# Altium integrated library Altium_WR-MJ (rev20b).IntLib: 83 symbols
Pins are listed as number, name and electrical type; pins without a type are passive.

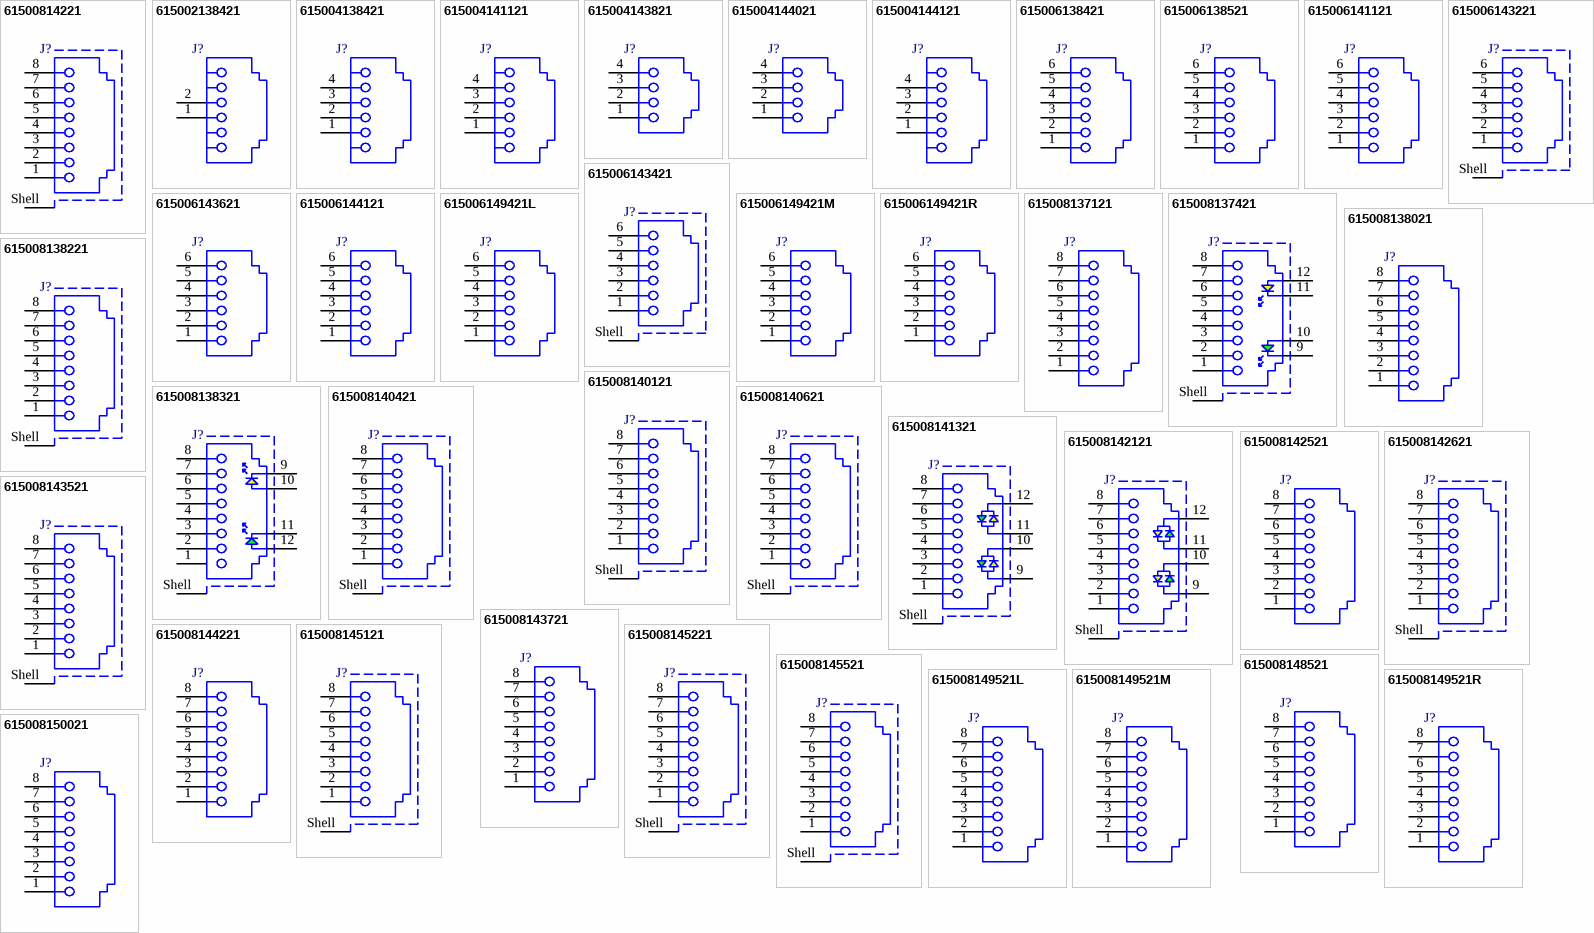
[diagram p0: symbols 61500814221 to 615008150021]

## 61500814221
designator J?
WR-MJ Modular Jack THT Horizontal Shielded 8P8C Tab Down; Manufacturer: Wurth Elektronik; Manufacturer Part Number: 61500814221; Rated Current: 1.5A; Contact Resistance: 20mOhm; Insulation Resistance: 500MOhm; Working Voltage: 120VAC; Withstanding Voltage: 1000VAC; ComponentLink1Description: Manufacturer; ComponentLink1URL: http://www.we-online.de; ComponentLink2Description: Datasheet; ComponentLink2URL: https://katalog.we-online.com/em/datasheet/61500814221.pdf; Packaging: Tray; Mounting Technology: THT; Operating Temperature: -40 to +85degC; Published Date: September 2020; xPxC: 8P8C; Type: Horizontal
footprint 61500814221
pins: 1, 2, 3, 4, 5, 6, 7, 8, Shell

## 615002138421
designator J?
WR-MJ Modular Jack THT Horizontal Plastic 6P2C Tab Up; Manufacturer: Wurth Elektronik; Manufacturer Part Number: 615002138421; Rated Current: 1.5A; Contact Resistance: 20mOhm; Insulation Resistance: 500MOhm; Working Voltage: 120VAC; Withstanding Voltage: 1000VAC; ComponentLink1Description: Manufacturer; ComponentLink1URL: http://www.we-online.de; ComponentLink2Description: Datasheet; ComponentLink2URL: https://katalog.we-online.com/em/datasheet/615002138421.pdf; Packaging: Tray; Mounting Technology: THT; Operating Temperature: -40 to +85degC; Published Date: September 2020; xPxC: 6P2C; Type: Horizontal
footprint 615002138421
pins: 1, 2

## 615004138421
designator J?
WR-MJ Modular Jack THT Horizontal Plastic 6P4C Tab Up; Manufacturer: Wurth Elektronik; Manufacturer Part Number: 615004138421; Rated Current: 1.5A; Contact Resistance: 20mOhm; Insulation Resistance: 500MOhm; Working Voltage: 120VAC; Withstanding Voltage: 1000VAC; ComponentLink1Description: Manufacturer; ComponentLink1URL: http://www.we-online.de; ComponentLink2Description: Datasheet; ComponentLink2URL: https://katalog.we-online.com/em/datasheet/615004138421.pdf; Packaging: Tray; Mounting Technology: THT; Operating Temperature: -40 to +85degC; Published Date: September 2020; xPxC: 6P4C; Type: Horizontal
footprint 615004138421
pins: 1, 2, 3, 4

## 615004141121
designator J?
WR-MJ Modular Jack THT Horizontal Plastic 6P4C Tab Down; Manufacturer: Wurth Elektronik; Manufacturer Part Number: 615004141121; Rated Current: 1.5A; Contact Resistance: 20mOhm; Insulation Resistance: 500MOhm; Working Voltage: 120VAC; Withstanding Voltage: 1000VAC; ComponentLink1Description: Manufacturer; ComponentLink1URL: http://www.we-online.de; ComponentLink2Description: Datasheet; ComponentLink2URL: https://katalog.we-online.com/em/datasheet/615004141121.pdf; Packaging: Tray; Mounting Technology: THT; Operating Temperature: -40 to +85degC; Published Date: September 2020; xPxC: 6P4C; Type: Horizontal
footprint 615004141121
pins: 1, 2, 3, 4

## 615004143821
designator J?
WR-MJ Modular Jack THT Horizontal Plastic 4P4C Tab Up; Manufacturer: Wurth Elektronik; Manufacturer Part Number: 615004143821; Rated Current: 1.5A; Contact Resistance: 20mOhm; Insulation Resistance: 500MOhm; Working Voltage: 120VAC; Withstanding Voltage: 1000VAC; ComponentLink1Description: Manufacturer; ComponentLink1URL: http://www.we-online.de; ComponentLink2Description: Datasheet; ComponentLink2URL: https://katalog.we-online.com/em/datasheet/615004143821.pdf; Packaging: Tray; Mounting Technology: THT; Operating Temperature: -40 to +85degC; Published Date: September 2020; xPxC: 4P4C; Type: Horizontal
footprint 615004143821
pins: 1, 2, 3, 4

## 615004144021
designator J?
WR-MJ Modular Jack THT Vertical Plastic 4P4C with Ears; Manufacturer: Wurth Elektronik; Manufacturer Part Number: 615004144021; Rated Current: 1.5A; Contact Resistance: 20mOhm; Insulation Resistance: 500MOhm; Working Voltage: 120VAC; Withstanding Voltage: 1000VAC; ComponentLink1Description: Manufacturer; ComponentLink1URL: http://www.we-online.de; ComponentLink2Description: Datasheet; ComponentLink2URL: https://katalog.we-online.com/em/datasheet/615004144021.pdf; Packaging: Tray; Mounting Technology: THT; Operating Temperature: -40 to +85degC; Published Date: September 2020; xPxC: 4P4C; Type: Vertical
footprint 615004144021
pins: 1, 2, 3, 4

## 615004144121
designator J?
WR-MJ Modular Jack THT Vertical Plastic 6P4C with Ears; Manufacturer: Wurth Elektronik; Manufacturer Part Number: 615004144121; Rated Current: 1.5A; Contact Resistance: 20mOhm; Insulation Resistance: 500MOhm; Working Voltage: 120VAC; Withstanding Voltage: 1000VAC; ComponentLink1Description: Manufacturer; ComponentLink1URL: http://www.we-online.de; ComponentLink2Description: Datasheet; ComponentLink2URL: https://katalog.we-online.com/em/datasheet/615004144121.pdf; Packaging: Tray; Mounting Technology: THT; Operating Temperature: -40 to +85degC; Published Date: September 2020; xPxC: 6P4C; Type: Vertical
footprint 615004144121
pins: 1, 2, 3, 4

## 615006138421
designator J?
WR-MJ Modular Jack THT Horizontal Plastic 6P6C Tab Up; Manufacturer: Wurth Elektronik; Manufacturer Part Number: 615006138421; Rated Current: 1.5A; Contact Resistance: 20mOhm; Insulation Resistance: 500MOhm; Working Voltage: 120VAC; Withstanding Voltage: 1000VAC; ComponentLink1Description: Manufacturer; ComponentLink1URL: http://www.we-online.de; ComponentLink2Description: Datasheet; ComponentLink2URL: https://katalog.we-online.com/em/datasheet/615006138421.pdf; Packaging: Tray; Mounting Technology: THT; Operating Temperature: -40 to +85degC; Published Date: September 2020; xPxC: 6P6C; Type: Horizontal
footprint 615006138421
pins: 1, 2, 3, 4, 5, 6

## 615006138521
designator J?
WR-MJ Modular Jack THT Vertical Plastic 6P6C with Ears; Manufacturer: Wurth Elektronik; Manufacturer Part Number: 615006138521; Rated Current: 1.5A; Contact Resistance: 20mOhm; Insulation Resistance: 500MOhm; Working Voltage: 120VAC; Withstanding Voltage: 1000VAC; ComponentLink1Description: Manufacturer; ComponentLink1URL: http://www.we-online.de; ComponentLink2Description: Datasheet; ComponentLink2URL: https://katalog.we-online.com/em/datasheet/615006138521.pdf; Packaging: Tray; Mounting Technology: THT; Operating Temperature: -40 to +85degC; Published Date: September 2020; xPxC: 6P6C; Type: Vertical
footprint 615006138521
pins: 1, 2, 3, 4, 5, 6

## 615006141121
designator J?
WR-MJ Modular Jack THT Horizontal Plastic 6P6C Tab Down; Manufacturer: Wurth Elektronik; Manufacturer Part Number: 615006141121; Rated Current: 1.5A; Contact Resistance: 20mOhm; Insulation Resistance: 500MOhm; Working Voltage: 120VAC; Withstanding Voltage: 1000VAC; ComponentLink1Description: Manufacturer; ComponentLink1URL: http://www.we-online.de; ComponentLink2Description: Datasheet; ComponentLink2URL: https://katalog.we-online.com/em/datasheet/615006141121.pdf; Packaging: Tray; Mounting Technology: THT; Operating Temperature: -40 to +85degC; Published Date: September 2020; xPxC: 6P6C; Type: Horizontal
footprint 615006141121
pins: 1, 2, 3, 4, 5, 6

## 615006143221
designator J?
WR-MJ Modular Jack THT Horizontal Shielded 6P6C Tab Up; Manufacturer: Wurth Elektronik; Manufacturer Part Number: 615006143221; Rated Current: 1.5A; Contact Resistance: 20mOhm; Insulation Resistance: 500MOhm; Working Voltage: 120VAC; Withstanding Voltage: 1000VAC; ComponentLink1Description: Manufacturer; ComponentLink1URL: http://www.we-online.de; ComponentLink2Description: Datasheet; ComponentLink2URL: https://katalog.we-online.com/em/datasheet/615006143221.pdf; Packaging: Tray; Mounting Technology: THT; Operating Temperature: -40 to +85degC; Published Date: September 2020; xPxC: 6P6C; Type: Horizontal
footprint 615006143221
pins: 1, 2, 3, 4, 5, 6, Shell

## 615006143421
designator J?
WR-MJ Modular Jack THT Horizontal Half Shielded 6P6C Tab Down; Manufacturer: Wurth Elektronik; Manufacturer Part Number: 615006143421; Rated Current: 1.5A; Contact Resistance: 20mOhm; Insulation Resistance: 500MOhm; Working Voltage: 120VAC; Withstanding Voltage: 1000VAC; ComponentLink1Description: Manufacturer; ComponentLink1URL: http://www.we-online.de; ComponentLink2Description: Datasheet; ComponentLink2URL: https://katalog.we-online.com/em/datasheet/615006143421.pdf; Packaging: Tray; Mounting Technology: THT; Operating Temperature: -40 to +85degC; Published Date: September 2020; xPxC: 6P6C; Type: Horizontal
footprint 615006143421
pins: 1, 2, 3, 4, 5, 6, Shell

## 615006143621
designator J?
WR-MJ Modular Jack THT Horizontal Plastic 6P6C Tab Down; Manufacturer: Wurth Elektronik; Manufacturer Part Number: 615006143621; Rated Current: 1.5A; Contact Resistance: 20mOhm; Insulation Resistance: 500MOhm; Working Voltage: 120VAC; Withstanding Voltage: 1000VAC; ComponentLink1Description: Manufacturer; ComponentLink1URL: http://www.we-online.de; ComponentLink2Description: Datasheet; ComponentLink2URL: https://katalog.we-online.com/em/datasheet/615006143621.pdf; Packaging: Tray; Mounting Technology: THT; Operating Temperature: -40 to +85degC; Published Date: September 2020; xPxC: 6P6C; Type: Horizontal
footprint 615006143621
pins: 1, 2, 3, 4, 5, 6

## 615006144121
designator J?
WR-MJ Modular Jack THT Vertical Plastic 6P6C with Ears; Manufacturer: Wurth Elektronik; Manufacturer Part Number: 615006144121; Rated Current: 1.5A; Contact Resistance: 20mOhm; Insulation Resistance: 500MOhm; Working Voltage: 120VAC; Withstanding Voltage: 1000VAC; ComponentLink1Description: Manufacturer; ComponentLink1URL: http://www.we-online.de; ComponentLink2Description: Datasheet; ComponentLink2URL: https://katalog.we-online.com/em/datasheet/615006144121.pdf; Packaging: Tray; Mounting Technology: THT; Operating Temperature: -40 to +85degC; Published Date: September 2020; xPxC: 6P6C; Type: Vertical
footprint 615006144121
pins: 1, 2, 3, 4, 5, 6

## 615006149421L
designator J?
WR-MJ Modular Jack THT Horizontal Plastic 6P6C Assembly Tab Up; Manufacturer: Wurth Elektronik; Manufacturer Part Number: 615006149421L; Rated Current: 1.5A; Contact Resistance: 20mOhm; Insulation Resistance: 500MOhm; Working Voltage: 120VAC; Withstanding Voltage: 1000VAC; ComponentLink1Description: Manufacturer; ComponentLink1URL: http://www.we-online.de; ComponentLink2Description: Datasheet; ComponentLink2URL: https://katalog.we-online.com/em/datasheet/615006149421L.pdf; Packaging: Tray; Mounting Technology: THT; Operating Temperature: -40 to +85degC; Published Date: September 2020; xPxC: 6P6C; Type: Horizontal
footprint 615006149421L
pins: 1, 2, 3, 4, 5, 6

## 615006149421M
designator J?
WR-MJ Modular Jack THT Horizontal Plastic 6P6C Assembly Tab Up; Manufacturer: Wurth Elektronik; Manufacturer Part Number: 615006149421M; Rated Current: 1.5A; Contact Resistance: 20mOhm; Insulation Resistance: 500MOhm; Working Voltage: 120VAC; Withstanding Voltage: 1000VAC; ComponentLink1Description: Manufacturer; ComponentLink1URL: http://www.we-online.de; ComponentLink2Description: Datasheet; ComponentLink2URL: https://katalog.we-online.com/em/datasheet/615006149421M.pdf; Packaging: Tray; Mounting Technology: THT; Operating Temperature: -40 to +85degC; Published Date: September 2020; xPxC: 6P6C; Type: Horizontal
footprint 615006149421M
pins: 1, 2, 3, 4, 5, 6

## 615006149421R
designator J?
WR-MJ Modular Jack THT Horizontal Plastic 6P6C Assembly Tab Up; Manufacturer: Wurth Elektronik; Manufacturer Part Number: 615006149421R; Rated Current: 1.5A; Contact Resistance: 20mOhm; Insulation Resistance: 500MOhm; Working Voltage: 120VAC; Withstanding Voltage: 1000VAC; ComponentLink1Description: Manufacturer; ComponentLink1URL: http://www.we-online.de; ComponentLink2Description: Datasheet; ComponentLink2URL: https://katalog.we-online.com/em/datasheet/615006149421R.pdf; Packaging: Tray; Mounting Technology: THT; Operating Temperature: -40 to +85degC; Published Date: September 2020; xPxC: 6P6C; Type: Horizontal
footprint 615006149421R
pins: 1, 2, 3, 4, 5, 6

## 615008137121
designator J?
WR-MJ Modular Jack THT Horizontal Plastic 8P8C Tab Down; Manufacturer: Wurth Elektronik; Manufacturer Part Number: 615008137121; Rated Current: 1.5A; Contact Resistance: 20mOhm; Insulation Resistance: 500MOhm; Working Voltage: 120VAC; Withstanding Voltage: 1000VAC; ComponentLink1Description: Manufacturer; ComponentLink1URL: http://www.we-online.de; ComponentLink2Description: Datasheet; ComponentLink2URL: https://katalog.we-online.com/em/datasheet/615008137121.pdf; Packaging: Tray; Mounting Technology: THT; Operating Temperature: -40 to +85degC; Published Date: September 2020; xPxC: 8P8C; Type: Horizontal
footprint 615008137121
pins: 1, 2, 3, 4, 5, 6, 7, 8

## 615008137421
designator J?
WR-MJ Modular Jack THT Horizontal Shielded 8P8C Tab Up; Manufacturer: Wurth Elektronik; Manufacturer Part Number: 615008137421; Rated Current: 1.5A; Contact Resistance: 20mOhm; Insulation Resistance: 500MOhm; Working Voltage: 120VAC; Withstanding Voltage: 1000VAC; ComponentLink1Description: Manufacturer; ComponentLink1URL: http://www.we-online.de; ComponentLink2Description: Datasheet; ComponentLink2URL: https://katalog.we-online.com/em/datasheet/615008137421.pdf; Packaging: Tray; Mounting Technology: THT; Operating Temperature: -40 to +85degC; Published Date: September 2020; xPxC: 8P8C; Type: Horizontal
footprint 615008137421
pins: 1, 2, 3, 4, 5, 6, 7, 8, 9, 10, 11, 12, Shell

## 615008138021
designator J?
WR-MJ Modular Jack THT Vertical Plastic 8P8C; Manufacturer: Wurth Elektronik; Manufacturer Part Number: 615008138021; Rated Current: 1.5A; Contact Resistance: 20mOhm; Insulation Resistance: 500MOhm; Working Voltage: 120VAC; Withstanding Voltage: 1000VAC; ComponentLink1Description: Manufacturer; ComponentLink1URL: http://www.we-online.de; ComponentLink2Description: Datasheet; ComponentLink2URL: https://katalog.we-online.com/em/datasheet/615008138021.pdf; Packaging: Tray; Mounting Technology: THT; Operating Temperature: -40 to +85degC; Published Date: September 2020; xPxC: 8P8C; Type: Vertical
footprint 615008138021
pins: 1, 2, 3, 4, 5, 6, 7, 8

## 615008138221
designator J?
WR-MJ Modular Jack THT Vertical Shielded 8P8C Front Post; Manufacturer: Wurth Elektronik; Manufacturer Part Number: 615008138221; Rated Current: 1.5A; Contact Resistance: 20mOhm; Insulation Resistance: 500MOhm; Working Voltage: 120VAC; Withstanding Voltage: 1000VAC; ComponentLink1Description: Manufacturer; ComponentLink1URL: http://www.we-online.de; ComponentLink2Description: Datasheet; ComponentLink2URL: https://katalog.we-online.com/em/datasheet/615008138221.pdf; Packaging: Tray; Mounting Technology: THT; Operating Temperature: -40 to +85degC; Published Date: September 2020; xPxC: 8P8C; Type: Vertical
footprint 615008138221
pins: 1, 2, 3, 4, 5, 6, 7, 8, Shell

## 615008138321
designator J?
WR-MJ Modular Jack THT Vertical Shielded 8P8C with LED; Manufacturer: Wurth Elektronik; Manufacturer Part Number: 615008138321; Rated Current: 1.5A; Contact Resistance: 20mOhm; Insulation Resistance: 500MOhm; Working Voltage: 120VAC; Withstanding Voltage: 1000VAC; ComponentLink1Description: Manufacturer; ComponentLink1URL: http://www.we-online.de; ComponentLink2Description: Datasheet; ComponentLink2URL: https://katalog.we-online.com/em/datasheet/615008138321.pdf; Packaging: Tray; Mounting Technology: THT; Operating Temperature: -40 to +85degC; Published Date: September 2020; xPxC: 8P8C; Type: Vertical
footprint 615008138321
pins: 1, 2, 3, 4, 5, 6, 7, 8, 9, 10, 11, 12, Shell

## 615008140121
designator J?
WR-MJ Modular Jack THT Horizontal Shielded Front Grounding Post 8P8C Tab Down; Manufacturer: Wurth Elektronik; Manufacturer Part Number: 615008140121; Rated Current: 1.5A; Contact Resistance: 20mOhm; Insulation Resistance: 500MOhm; Working Voltage: 120VAC; Withstanding Voltage: 1000VAC; ComponentLink1Description: Manufacturer; ComponentLink1URL: http://www.we-online.de; ComponentLink2Description: Datasheet; ComponentLink2URL: https://katalog.we-online.com/em/datasheet/615008140121.pdf; Packaging: Tray; Mounting Technology: THT; Operating Temperature: -40 to +85degC; Published Date: September 2020; xPxC: 8P8C; Type: Horizontal
footprint 615008140121
pins: 1, 2, 3, 4, 5, 6, 7, 8, Shell

## 615008140421
designator J?
WR-MJ Modular Jack THT Vertical Shielded 8P8C Rear Post; Manufacturer: Wurth Elektronik; Manufacturer Part Number: 615008140421; Rated Current: 1.5A; Contact Resistance: 20mOhm; Insulation Resistance: 500MOhm; Working Voltage: 120VAC; Withstanding Voltage: 1000VAC; ComponentLink1Description: Manufacturer; ComponentLink1URL: http://www.we-online.de; ComponentLink2Description: Datasheet; ComponentLink2URL: https://katalog.we-online.com/em/datasheet/615008140421.pdf; Packaging: Tray; Mounting Technology: THT; Operating Temperature: -40 to +85degC; Published Date: September 2020; xPxC: 8P8C; Type: Vertical
footprint 615008140421
pins: 1, 2, 3, 4, 5, 6, 7, 8, Shell

## 615008140621
designator J?
WR-MJ Modular Jack THT Horizontal Shielded with EMI Panel Finger 8P8C Tab Up; Manufacturer: Wurth Elektronik; Manufacturer Part Number: 615008140621; Rated Current: 1.5A; Contact Resistance: 20mOhm; Insulation Resistance: 500MOhm; Working Voltage: 120VAC; Withstanding Voltage: 1000VAC; ComponentLink1Description: Manufacturer; ComponentLink1URL: http://www.we-online.de; ComponentLink2Description: Datasheet; ComponentLink2URL: https://katalog.we-online.com/em/datasheet/615008140621.pdf; Packaging: Tray; Mounting Technology: THT; Operating Temperature: -40 to +85degC; Published Date: September 2020; xPxC: 8P8C; Type: Horizontal
footprint 615008140621
pins: 1, 2, 3, 4, 5, 6, 7, 8, Shell

## 615008141321
designator J?
WR-MJ Modular Jack THT Horizontal Shielded 8P8C Tab Up; Manufacturer: Wurth Elektronik; Manufacturer Part Number: 615008141321; Rated Current: 1.5A; Contact Resistance: 20mOhm; Insulation Resistance: 500MOhm; Working Voltage: 120VAC; Withstanding Voltage: 1000VAC; ComponentLink1Description: Manufacturer; ComponentLink1URL: http://www.we-online.de; ComponentLink2Description: Datasheet; ComponentLink2URL: https://katalog.we-online.com/em/datasheet/615008141321.pdf; Packaging: Tray; Mounting Technology: THT; Operating Temperature: -40 to +85degC; Published Date: September 2020; xPxC: 8P8C; Type: Horizontal
footprint 615008141321
pins: 1, 2, 3, 4, 5, 6, 7, 8, 9, 10, 11, 12, Shell

## 615008142121
designator J?
WR-MJ Modular Jack THT Horizontal Shielded 8P8C Tab Up; Manufacturer: Wurth Elektronik; Manufacturer Part Number: 615008142121; Rated Current: 1.5A; Contact Resistance: 20mOhm; Insulation Resistance: 500MOhm; Working Voltage: 120VAC; Withstanding Voltage: 1000VAC; ComponentLink1Description: Manufacturer; ComponentLink1URL: http://www.we-online.de; ComponentLink2Description: Datasheet; ComponentLink2URL: https://katalog.we-online.com/em/datasheet/615008142121.pdf; Packaging: Tray; Mounting Technology: THT; Operating Temperature: -40 to +85degC; Published Date: September 2020; xPxC: 8P8C; Type: Horizontal
footprint 615008142121
pins: 1, 2, 3, 4, 5, 6, 7, 8, 9, 10, 11, 12, Shell

## 615008142521
designator J?
WR-MJ Modular Jack THT 45deg Plastic 8P8C; Manufacturer: Wurth Elektronik; Manufacturer Part Number: 615008142521; Rated Current: 1.5A; Contact Resistance: 20mOhm; Insulation Resistance: 500MOhm; Working Voltage: 120VAC; Withstanding Voltage: 1000VAC; ComponentLink1Description: Manufacturer; ComponentLink1URL: http://www.we-online.de; ComponentLink2Description: Datasheet; ComponentLink2URL: https://katalog.we-online.com/em/datasheet/615008142521.pdf; Packaging: Tray; Mounting Technology: THT; Operating Temperature: -40 to +85degC; Published Date: September 2020; xPxC: 8P8C; Type: 45deg
footprint 615008142521
pins: 1, 2, 3, 4, 5, 6, 7, 8

## 615008142621
designator J?
WR-MJ Modular Jack THT Horizontal Shielded Rear Grounding Post 8P8C Tab Down; Manufacturer: Wurth Elektronik; Manufacturer Part Number: 615008142621; Rated Current: 1.5A; Contact Resistance: 20mOhm; Insulation Resistance: 500MOhm; Working Voltage: 120VAC; Withstanding Voltage: 1000VAC; ComponentLink1Description: Manufacturer; ComponentLink1URL: http://www.we-online.de; ComponentLink2Description: Datasheet; ComponentLink2URL: https://katalog.we-online.com/em/datasheet/615008142621.pdf; Packaging: Tray; Mounting Technology: THT; Operating Temperature: -40 to +85degC; Published Date: September 2020; xPxC: 8P8C; Type: Horizontal
footprint 615008142621
pins: 1, 2, 3, 4, 5, 6, 7, 8, Shell

## 615008143521
designator J?
WR-MJ Modular Jack THT Horizontal Half Shielded 8P8C Tab Down; Manufacturer: Wurth Elektronik; Manufacturer Part Number: 615008143521; Rated Current: 1.5A; Contact Resistance: 20mOhm; Insulation Resistance: 500MOhm; Working Voltage: 120VAC; Withstanding Voltage: 1000VAC; ComponentLink1Description: Manufacturer; ComponentLink1URL: http://www.we-online.de; ComponentLink2Description: Datasheet; ComponentLink2URL: https://katalog.we-online.com/em/datasheet/615008143521.pdf; Packaging: Tray; Mounting Technology: THT; Operating Temperature: -40 to +85degC; Published Date: September 2020; xPxC: 8P8C; Type: Horizontal
footprint 615008143521
pins: 1, 2, 3, 4, 5, 6, 7, 8, Shell

## 615008143721
designator J?
WR-MJ Modular Jack THT Horizontal Plastic 8P8C Tab Down; Manufacturer: Wurth Elektronik; Manufacturer Part Number: 615008143721; Rated Current: 1.5A; Contact Resistance: 20mOhm; Insulation Resistance: 500MOhm; Working Voltage: 120VAC; Withstanding Voltage: 1000VAC; ComponentLink1Description: Manufacturer; ComponentLink1URL: http://www.we-online.de; ComponentLink2Description: Datasheet; ComponentLink2URL: https://katalog.we-online.com/em/datasheet/615008143721.pdf; Packaging: Tray; Mounting Technology: THT; Operating Temperature: -40 to +85degC; Published Date: September 2020; xPxC: 8P8C; Type: Horizontal
footprint 615008143721
pins: 1, 2, 3, 4, 5, 6, 7, 8

## 615008144221
designator J?
WR-MJ Modular Jack THT Vertical Plastic 8P8C with Ears; Manufacturer: Wurth Elektronik; Manufacturer Part Number: 615008144221; Rated Current: 1.5A; Contact Resistance: 20mOhm; Insulation Resistance: 500MOhm; Working Voltage: 120VAC; Withstanding Voltage: 1000VAC; ComponentLink1Description: Manufacturer; ComponentLink1URL: http://www.we-online.de; ComponentLink2Description: Datasheet; ComponentLink2URL: https://katalog.we-online.com/em/datasheet/615008144221.pdf; Packaging: Tray; Mounting Technology: THT; Operating Temperature: -40 to +85degC; Published Date: September 2020; xPxC: 8P8C; Type: Vertical
footprint 615008144221
pins: 1, 2, 3, 4, 5, 6, 7, 8

## 615008145121
designator J?
WR-MJ Modular Jack THT 45deg Entry Shielded 8P8C Standard & Reverse Metal Post Trail; Manufacturer: Wurth Elektronik; Manufacturer Part Number: 615008145121; Rated Current: 1.5A; Contact Resistance: 20mOhm; Insulation Resistance: 500MOhm; Working Voltage: 120VAC; Withstanding Voltage: 1000VAC; ComponentLink1Description: Manufacturer; ComponentLink1URL: http://www.we-online.de; ComponentLink2Description: Datasheet; ComponentLink2URL: https://katalog.we-online.com/em/datasheet/615008145121.pdf; Packaging: Tray; Mounting Technology: THT; Operating Temperature: -40 to +85degC; Published Date: September 2020; xPxC: 8P8C; Type: 45deg
footprint 615008145121
pins: 1, 2, 3, 4, 5, 6, 7, 8, Shell

## 615008145221
designator J?
WR-MJ Modular Jack THT 45deg Entry Shielded 8P8C Standard & Reverse Metal Post Trail; Manufacturer: Wurth Elektronik; Manufacturer Part Number: 615008145221; Rated Current: 1.5A; Contact Resistance: 20mOhm; Insulation Resistance: 500MOhm; Working Voltage: 120VAC; Withstanding Voltage: 1000VAC; ComponentLink1Description: Manufacturer; ComponentLink1URL: http://www.we-online.de; ComponentLink2Description: Datasheet; ComponentLink2URL: https://katalog.we-online.com/em/datasheet/615008145221.pdf; Packaging: Tray; Mounting Technology: THT; Operating Temperature: -40 to +85degC; Published Date: September 2020; xPxC: 8P8C; Type: 45deg
footprint 615008145221
pins: 1, 2, 3, 4, 5, 6, 7, 8, Shell

## 615008145521
designator J?
WR-MJ Modular Jack THT Horizontal Shielded with EMI Panel Finger 8P8C CAT 5e Tab Down; Manufacturer: Wurth Elektronik; Manufacturer Part Number: 615008145521; Rated Current: 1.5A; Contact Resistance: 20mOhm; Insulation Resistance: 500MOhm; Working Voltage: 125VAC; Withstanding Voltage: 1000VAC; ComponentLink1Description: Manufacturer; ComponentLink1URL: http://www.we-online.de; ComponentLink2Description: Datasheet; ComponentLink2URL: https://katalog.we-online.com/em/datasheet/615008145521.pdf; Packaging: Tray; Mounting Technology: THT; Operating Temperature: -40 to +85degC; Published Date: September 2020; xPxC: 8P8C; Type: Horizontal
footprint 615008145521
pins: 1, 2, 3, 4, 5, 6, 7, 8, Shell

## 615008148521
designator J?
WR-MJ Modular Jack THT Horizontal Plastic 8P8C Tab Up; Manufacturer: Wurth Elektronik; Manufacturer Part Number: 615008148521; Rated Current: 1.5A; Contact Resistance: 20mOhm; Insulation Resistance: 500MOhm; Working Voltage: 120VAC; Withstanding Voltage: 1000VAC; ComponentLink1Description: Manufacturer; ComponentLink1URL: http://www.we-online.de; ComponentLink2Description: Datasheet; ComponentLink2URL: https://katalog.we-online.com/em/datasheet/615008148521.pdf; Packaging: Tray; Mounting Technology: THT; Operating Temperature: -40 to +85degC; Published Date: September 2020; xPxC: 8P8C; Type: Horizontal
footprint 615008148521
pins: 1, 2, 3, 4, 5, 6, 7, 8

## 615008149521L
designator J?
WR-MJ Modular Jack THT Horizontal Plastic 8P8C Assembly Tab Up; Manufacturer: Wurth Elektronik; Manufacturer Part Number: 615008149521L; Rated Current: 1.5A; Contact Resistance: 20mOhm; Insulation Resistance: 500MOhm; Working Voltage: 120VAC; Withstanding Voltage: 1000VAC; ComponentLink1Description: Manufacturer; ComponentLink1URL: http://www.we-online.de; ComponentLink2Description: Datasheet; ComponentLink2URL: https://katalog.we-online.com/em/datasheet/615008149521L.pdf; Packaging: Tray; Mounting Technology: THT; Operating Temperature: -40 to +85degC; Published Date: September 2020; xPxC: 8P8C; Type: Horizontal
footprint 615008149521L
pins: 1, 2, 3, 4, 5, 6, 7, 8

## 615008149521M
designator J?
WR-MJ Modular Jack THT Horizontal Plastic 8P8C Assembly Tab Up; Manufacturer: Wurth Elektronik; Manufacturer Part Number: 615008149521M; Rated Current: 1.5A; Contact Resistance: 20mOhm; Insulation Resistance: 500MOhm; Working Voltage: 120VAC; Withstanding Voltage: 1000VAC; ComponentLink1Description: Manufacturer; ComponentLink1URL: http://www.we-online.de; ComponentLink2Description: Datasheet; ComponentLink2URL: https://katalog.we-online.com/em/datasheet/615008149521M.pdf; Packaging: Tray; Mounting Technology: THT; Operating Temperature: -40 to +85degC; Published Date: September 2020; xPxC: 8P8C; Type: Horizontal
footprint 615008149521M
pins: 1, 2, 3, 4, 5, 6, 7, 8

## 615008149521R
designator J?
WR-MJ Modular Jack THT Horizontal Plastic 8P8C Assembly Tab Up; Manufacturer: Wurth Elektronik; Manufacturer Part Number: 615008149521R; Rated Current: 1.5A; Contact Resistance: 20mOhm; Insulation Resistance: 500MOhm; Working Voltage: 120VAC; Withstanding Voltage: 1000VAC; ComponentLink1Description: Manufacturer; ComponentLink1URL: http://www.we-online.de; ComponentLink2Description: Datasheet; ComponentLink2URL: https://katalog.we-online.com/em/datasheet/615008149521R.pdf; Packaging: Tray; Mounting Technology: THT; Operating Temperature: -40 to +85degC; Published Date: September 2020; xPxC: 8P8C; Type: Horizontal
footprint 615008149521R
pins: 1, 2, 3, 4, 5, 6, 7, 8

## 615008150021
designator J?
WR-MJ Modular Jack THT Horizontal Mid-Mount Plastic 8P8C Tab Up; Manufacturer: Wurth Elektronik; Manufacturer Part Number: 615008150021; Rated Current: 1.5A; Contact Resistance: 20mOhm; Insulation Resistance: 1000MOhm; Working Voltage: 125VAC; Withstanding Voltage: 1000VAC; ComponentLink1Description: Manufacturer; ComponentLink1URL: http://www.we-online.de; ComponentLink2Description: Datasheet; ComponentLink2URL: https://katalog.we-online.com/em/datasheet/615008150021.pdf; Packaging: Tray; Mounting Technology: THT; Operating Temperature: -40 to +85degC; Published Date: September 2020; xPxC: 8P8C; Type: Horizontal
footprint 615008150021
pins: 1, 2, 3, 4, 5, 6, 7, 8
